# Altium footprint library Relays.PcbLib: 115 footprints (part 4 of 8) (continued)
## REL_OMRON_G6K-2F-RF-T [mm] "SMD Relay,  Body 10.7mm x 6.9mm, OMRON G6KU-2F-RF-T" (continued)
Mechanical 14:
  lines w0.1: -5.513,-3.45 5.488,-3.45 ; -5.513,3.45 5.488,3.45 ; -4.663,-3.45 -4.663,-4.3 -5.513,-4.3 -5.513,-3.25 -5.15,-3.25 -5.15,3.25 -5.513,3.25 -5.513,4.3 -4.663,4.3 -4.663,3.45 ; -4.05,-3.45 -4.05,-4.05 -3.55,-4.05 -3.55,-3.45 ; -4.05,3.45 -4.05,4.05 -3.55,4.05 -3.55,3.45 ; -1.95,-3.45 -1.95,-4.3 -1.45,-4.3 -1.45,-3.45 ; -1.95,3.45 -1.95,4.3 -1.45,4.3 -1.45,3.45 ; -0.85,-3.45 -0.85,-4.05 -0.35,-4.05 -0.35,-3.45 ; -0.85,3.45 -0.85,4.05 -0.35,4.05 -0.35,3.45 ; 0.25,-3.45 0.25,-4.3 0.75,-4.3 0.75,-3.45 ; 0.25,3.45 0.25,4.3 0.75,4.3 0.75,3.45 ; 1.35,-3.45 1.35,-4.05 1.85,-4.05 1.85,-3.45 ; 1.35,3.45 1.35,4.05 1.85,4.05 1.85,3.45 ; 2.45,-3.45 2.45,-4.3 2.95,-4.3 2.95,-3.45 ; 2.45,3.45 2.45,4.3 2.95,4.3 2.95,3.45 ; 3.55,-3.45 3.55,-4.05 4.05,-4.05 4.05,-3.45 ; 3.55,3.45 3.55,4.05 4.05,4.05 4.05,3.45 ; 4.638,-3.45 4.638,-4.3 5.488,-4.3 5.488,-3.25 5.15,-3.25 5.15,3.25 5.488,3.25 5.488,4.3 4.638,4.3 4.638,3.45 ; -4.45,-2.25 ccw(c-4.2,-2.25) -3.95,-2.25 -3.95,2.25 ccw(c-4.2,2.25) -4.45,2.25 -4.45,-2.25
Mechanical 15:
  lines w0.05: -5.975,-5.65 5.975,-5.65 5.975,5.65 -5.975,5.65 -5.975,-5.65
3D body "REL_OMRON_G6K-2F-RF-T.stp": height 5.4, standoff 0, extent -5.512,-4.3 5.488,4.3

## REL_OMRON_G6K-2G-Y [mm] "SMD Relay,  Body 10.2mm x 6.7mm, (Inside-L Surface Mounting Terminal)OMRON_G6K-2F"
height 5.4
pads (8):
  rect 0.8x1.8 smd: 1(-3.9,-2.85) 2(-0.7,-2.85) 3(1.5,-2.85) 4(3.7,-2.85) 5(3.7,2.85) 6(1.5,2.85) 7(-0.7,2.85) 8(-3.9,2.85)
Top Overlay:
  circle w0.2: c1.5,-1.1 r0.159
  circle w0.2: c1.5,1.1 r0.159
  lines w0.2: -4.9,-1.2 -4.9,1.2 ; -4.8,-1.2 -4.8,1.2 ; -4.7,-3.35 -5.2,-3.35 -5.2,3.35 -4.7,3.35 ; -3.6,-1.5 -3.6,-0.5 ; -3.6,0.5 -3.6,1.4 ; -3.1,-3.35 -1.5,-3.35 ; -3.1,3.35 -1.5,3.35 ; -0.7,-1.5 -0.7,-0.6 0,-0.6 ; -0.7,1.5 -0.7,0.6 0,0.6 ; 0.1,-3.35 0.7,-3.35 ; 0.1,3.35 0.7,3.35 ; 0.6,-0.3 1.5,-1.1 ; 0.6,0.3 1.5,1.1 1.47,1.056 ; 1.5,-1.6 1.5,-1.3 ; 1.5,1.3 1.5,1.6 ; 2.3,-3.35 2.9,-3.35 ; 2.3,3.35 2.9,3.35 ; 2.6,-0.6 3.7,-0.6 3.7,-1.5 ; 2.6,0.6 3.7,0.6 3.7,1.5 ; 4.5,-3.35 5.2,-3.35 5.2,3.35 4.5,3.35 ; -5.1,-1.2 -4.7,-1.2 -4.7,1.2 -5.1,1.2 -5.1,-1.2 ; -4.3,-0.5 -4.3,0.5 -2.9,0.5 -2.9,-0.5 -4.3,-0.5 ; 0,-0.759 0.635,-0.6 0,-0.441 0,-0.759 ; 0,0.441 0,0.759 0.635,0.6 0,0.441 ; 1.965,-0.6 2.6,-0.759 2.6,-0.441 1.965,-0.6 ; 1.965,0.6 2.6,0.441 2.6,0.759 1.965,0.6
Mechanical 8:
  lines w0.1: -4.9,-2.85 -3.9,-2.85 ; -4.9,2.85 -3.9,2.85 ; -3.9,-3.85 -3.9,-2.85 ; -3.9,-1.85 -3.9,-2.85 ; -3.9,1.85 -3.9,2.85 ; -3.9,3.85 -3.9,2.85 ; -2.9,-2.85 -3.9,-2.85 ; -2.9,2.85 -3.9,2.85 ; -1.7,-2.85 -0.7,-2.85 ; -1.7,2.85 -0.7,2.85 ; -1,0 0,0 ; -0.7,-3.85 -0.7,-2.85 ; -0.7,-1.85 -0.7,-2.85 ; -0.7,1.85 -0.7,2.85 ; -0.7,3.85 -0.7,2.85 ; 0,-1 0,0 ; 0,1 0,0 ; 0.3,-2.85 -0.7,-2.85 ; 0.3,2.85 -0.7,2.85 ; 0.5,-2.85 1.5,-2.85 ; 0.5,2.85 1.5,2.85 ; 1,0 0,0 ; 1.5,-3.85 1.5,-2.85 ; 1.5,-1.85 1.5,-2.85 ; 1.5,1.85 1.5,2.85 ; 1.5,3.85 1.5,2.85 ; 2.5,-2.85 1.5,-2.85 ; 2.5,2.85 1.5,2.85 ; 2.7,-2.85 3.7,-2.85 ; 2.7,2.85 3.7,2.85 ; 3.7,-3.85 3.7,-2.85 ; 3.7,-1.85 3.7,-2.85 ; 3.7,1.85 3.7,2.85 ; 3.7,3.85 3.7,2.85 ; 4.7,-2.85 3.7,-2.85 ; 4.7,2.85 3.7,2.85 ; -4.3,-3.75 -4.3,-1.95 -3.5,-1.95 -3.5,-3.75 -4.3,-3.75 ; -4.3,1.95 -4.3,3.75 -3.5,3.75 -3.5,1.95 -4.3,1.95 ; -1.1,-3.75 -1.1,-1.95 -0.3,-1.95 -0.3,-3.75 -1.1,-3.75 ; -1.1,1.95 -1.1,3.75 -0.3,3.75 -0.3,1.95 -1.1,1.95 ; 1.1,-3.75 1.1,-1.95 1.9,-1.95 1.9,-3.75 1.1,-3.75 ; 1.1,1.95 1.1,3.75 1.9,3.75 1.9,1.95 1.1,1.95 ; 3.3,-3.75 3.3,-1.95 4.1,-1.95 4.1,-3.75 3.3,-3.75 ; 3.3,1.95 3.3,3.75 4.1,3.75 4.1,1.95 3.3,1.95
Mechanical 14:
  circle w0.1: c1.5,1.1 r0.159
  circle w0.1: c1.5,-1.1 r0.159
  lines w0.1: -4.9,-1.2 -4.9,1.2 ; -4.8,-1.2 -4.8,1.2 ; -4.7,-1.2 -4.7,1.2 ; -3.6,-1.5 -3.6,-0.5 ; -3.6,0.5 -3.6,1.4 ; -0.7,-1.5 -0.7,-0.6 0,-0.6 ; -0.7,1.5 -0.7,0.6 0,0.6 ; 0.6,-0.3 1.5,-1.1 ; 0.6,0.3 1.5,1.1 1.47,1.056 ; 1.5,-1.6 1.5,-1.3 ; 1.5,1.3 1.5,1.6 ; 2.6,-0.6 3.7,-0.6 3.7,-1.5 ; 2.6,0.6 3.7,0.6 3.7,1.5 ; -5.2,-3.35 -5.2,3.35 5.2,3.35 5.2,-3.35 -5.2,-3.35 ; -5.1,-1.2 -5.1,1.2 -4.6,1.2 -4.6,-1.2 -5.1,-1.2 ; -4.6,-1.29 ccw(c-4.1,-1.29) -3.6,-1.29 -3.6,1.29 ccw(c-4.1,1.289) -4.6,1.289 -4.6,-1.29 ; -4.3,-0.5 -2.9,-0.5 -2.9,0.5 -4.3,0.5 -4.3,-0.5 ; 0,-0.759 0,-0.441 0.635,-0.6 0,-0.759 ; 0,0.441 0.635,0.6 0,0.759 0,0.441 ; 1.965,-0.6 2.6,-0.441 2.6,-0.759 1.965,-0.6 ; 1.965,0.6 2.6,0.759 2.6,0.441 1.965,0.6
Mechanical 15:
  lines w0.05: -5.45,-4 -5.45,4 5.45,4 5.45,-4 -5.45,-4
3D body "REL_OMRON_G6K-2G-Y.stp": height 5.4, standoff 0, extent -5.2,-3.45 5.2,3.45

## REL_OMRON_G6K-2P-Y [mm] "THT Relay,  Body 10.2mm x 6.5mm, OMRON_G6K-2P"
height 5
pads (8):
  rect 1.6x1.6 hole 0.9: 1(-3.8,-2.54)
  round 1.6 hole 0.9: 2(-0.6,-2.54) 3(1.6,-2.54) 4(3.8,-2.54) 5(3.8,2.54) 6(1.6,2.54) 7(-0.6,2.54) 8(-3.8,2.54)
Top Overlay:
  lines w0.2: -4.9,-3.35 -5.1,-3.35 -5.1,3.35 -4.544,3.35 ; -3.056,3.35 -1.344,3.35 ; -2.7,-3.35 -1.344,-3.35 ; 0.144,-3.35 0.856,-3.35 ; 0.144,3.35 0.856,3.35 ; 2.344,-3.35 3.056,-3.35 ; 2.344,3.35 3.056,3.35 ; 4.544,-3.35 5.1,-3.35 5.1,3.35 4.544,3.35 ; -4.85,-1.1 ccw(c-4.6,-1.1) -4.35,-1.1 -4.35,-0.1 ccw(c-4.6,-0.1) -4.85,-0.1 -4.85,-1.1
Mechanical 8:
  lines w0.1: -4.3,-2.54 -3.8,-2.54 ; -4.3,2.54 -3.8,2.54 ; -3.8,-3.04 -3.8,-2.54 ; -3.8,-2.04 -3.8,-2.54 ; -3.8,2.04 -3.8,2.54 ; -3.8,3.04 -3.8,2.54 ; -3.3,-2.54 -3.8,-2.54 ; -3.3,2.54 -3.8,2.54 ; -1.1,-2.54 -0.6,-2.54 ; -1.1,2.54 -0.6,2.54 ; -0.6,-3.04 -0.6,-2.54 ; -0.6,-2.04 -0.6,-2.54 ; -0.6,2.04 -0.6,2.54 ; -0.6,3.04 -0.6,2.54 ; -0.5,0 0,0 ; -0.1,-2.54 -0.6,-2.54 ; -0.1,2.54 -0.6,2.54 ; 0,-0.5 0,0 ; 0,0.5 0,0 ; 0.5,0 0,0 ; 1.1,-2.54 1.6,-2.54 ; 1.1,2.54 1.6,2.54 ; 1.6,-3.04 1.6,-2.54 ; 1.6,-2.04 1.6,-2.54 ; 1.6,2.04 1.6,2.54 ; 1.6,3.04 1.6,2.54 ; 2.1,-2.54 1.6,-2.54 ; 2.1,2.54 1.6,2.54 ; 3.3,-2.54 3.8,-2.54 ; 3.3,2.54 3.8,2.54 ; 3.8,-3.04 3.8,-2.54 ; 3.8,-2.04 3.8,-2.54 ; 3.8,2.04 3.8,2.54 ; 3.8,3.04 3.8,2.54 ; 4.3,-2.54 3.8,-2.54 ; 4.3,2.54 3.8,2.54
Mechanical 14:
  lines w0.1: -5.1,-3.35 -5.1,3.35 5.1,3.35 5.1,-3.35 -5.1,-3.35 ; -4.85,-1.1 ccw(c-4.6,-1.1) -4.35,-1.1 -4.35,-0.1 ccw(c-4.6,-0.1) -4.85,-0.1 -4.85,-1.1 ; -0.75,2.6 ccw(c0,2.6) 0.75,2.6 0.75,3.35 -0.75,3.35 -0.75,2.6
3D body "REL_OMRON_G6K-2P-Y.stp": height 5, standoff -3.5, extent -5.1,-3.35 5.1,3.35

## REL_OMRON_G6KU-2F-Y [mm] "SMD Relay,  Body 10.2mm x 6.7mm, OMRON_G6KU-2F-Y"
height 5.4
pads (8):
  rect 0.8x1.8 smd: 1(-3.8,-3.5) 2(-0.6,-3.5) 3(1.6,-3.5) 4(3.8,-3.5) 5(3.8,3.5) 6(1.6,3.5) 7(-0.6,3.5) 8(-3.8,3.5)
Top Overlay:
  circle w0.2: c1.6,-1.8 r0.159
  circle w0.2: c1.6,1.8 r0.159
  lines w0.2: -5,-1.2 -4.6,-1.2 -4.6,1.2 -5,1.2 ; -4.9,-1.2 -4.9,1.2 ; -4.8,-1.2 -4.8,1.2 ; -4.7,-1.2 -4.7,1.2 ; -4.6,-3.35 -5.1,-3.35 -5.1,3.35 -4.6,3.35 ; -3.8,-2.15 -3.8,-0.6 ; -3.8,0.6 -3.8,2.15 ; -3,-3.35 -1.4,-3.35 ; -3,3.35 -1.4,3.35 ; -0.6,-2.15 -0.6,-0.6 0.1,-0.6 ; -0.6,2.15 -0.6,0.6 0.1,0.6 ; 0.2,-3.35 0.8,-3.35 ; 0.2,3.35 0.8,3.35 ; 0.593,-0.338 1.5,-1.675 ; 0.593,0.338 1.5,1.675 ; 1.6,-2.15 1.6,-2 ; 1.6,2 1.6,2.15 ; 2.4,-3.35 3,-3.35 ; 2.4,3.35 3,3.35 ; 2.7,-0.6 3.8,-0.6 3.8,-2.15 ; 2.7,0.6 3.8,0.6 3.8,2.15 ; 4.6,-3.35 5.1,-3.35 5.1,3.35 4.6,3.35 ; -4.2,-0.5 -2.8,-0.5 -2.8,0.5 -4.2,0.5 -4.2,-0.5 ; 0.1,-0.759 0.1,-0.441 0.735,-0.6 0.1,-0.759 ; 0.1,0.441 0.735,0.6 0.1,0.759 0.1,0.441 ; 2.065,-0.6 2.7,-0.441 2.7,-0.759 2.065,-0.6 ; 2.065,0.6 2.7,0.759 2.7,0.441 2.065,0.6
  text "+" at -3.234,-1.785 h0.8
  text "-" at -3.284,0.89 h0.8
Mechanical 8:
  lines w0.1: -4.3,-3.5 -3.8,-3.5 ; -4.3,3.5 -3.8,3.5 ; -3.8,-4 -3.8,-3.5 ; -3.8,-3 -3.8,-3.5 ; -3.8,3 -3.8,3.5 ; -3.8,4 -3.8,3.5 ; -3.3,-3.5 -3.8,-3.5 ; -3.3,3.5 -3.8,3.5 ; -1.1,-3.5 -0.6,-3.5 ; -1.1,3.5 -0.6,3.5 ; -0.6,-4 -0.6,-3.5 ; -0.6,-3 -0.6,-3.5 ; -0.6,3 -0.6,3.5 ; -0.6,4 -0.6,3.5 ; -0.5,0 0,0 ; -0.1,-3.5 -0.6,-3.5 ; -0.1,3.5 -0.6,3.5 ; 0,-0.5 0,0 ; 0,0.5 0,0 ; 0.5,0 0,0 ; 1.1,-3.5 1.6,-3.5 ; 1.1,3.5 1.6,3.5 ; 1.6,-4 1.6,-3.5 ; 1.6,-3 1.6,-3.5 ; 1.6,3 1.6,3.5 ; 1.6,4 1.6,3.5 ; 2.1,-3.5 1.6,-3.5 ; 2.1,3.5 1.6,3.5 ; 3.3,-3.5 3.8,-3.5 ; 3.3,3.5 3.8,3.5 ; 3.8,-4 3.8,-3.5 ; 3.8,-3 3.8,-3.5 ; 3.8,3 3.8,3.5 ; 3.8,4 3.8,3.5 ; 4.3,-3.5 3.8,-3.5 ; 4.3,3.5 3.8,3.5 ; -4.2,-4.4 -3.4,-4.4 -3.4,-2.6 -4.2,-2.6 -4.2,-4.4 ; -4.2,2.6 -3.4,2.6 -3.4,4.4 -4.2,4.4 -4.2,2.6 ; -1,-4.4 -0.2,-4.4 -0.2,-2.6 -1,-2.6 -1,-4.4 ; -1,2.6 -0.2,2.6 -0.2,4.4 -1,4.4 -1,2.6 ; 1.2,-4.4 2,-4.4 2,-2.6 1.2,-2.6 1.2,-4.4 ; 1.2,2.6 2,2.6 2,4.4 1.2,4.4 1.2,2.6 ; 3.4,-4.4 4.2,-4.4 4.2,-2.6 3.4,-2.6 3.4,-4.4 ; 3.4,2.6 4.2,2.6 4.2,4.4 3.4,4.4 3.4,2.6
Mechanical 14:
  circle w0.1: c1.6,-1.8 r0.159
  circle w0.1: c1.6,1.8 r0.159
  lines w0.1: -5,-1.2 -4.5,-1.2 -4.5,1.2 -5,1.2 ; -4.9,-1.2 -4.9,1.2 ; -4.8,-1.2 -4.8,1.2 ; -4.7,-1.2 -4.7,1.2 ; -4.6,-1.2 -4.6,1.2 ; -3.8,-2.15 -3.8,-0.6 ; -3.8,0.6 -3.8,2.15 ; -0.6,-2.15 -0.6,-0.6 0.1,-0.6 ; -0.6,2.15 -0.6,0.6 0.1,0.6 ; 0.593,-0.338 1.5,-1.675 ; 0.593,0.338 1.5,1.675 ; 1.6,-2.15 1.6,-2 ; 1.6,2 1.6,2.15 ; 2.7,-0.6 3.8,-0.6 3.8,-2.15 ; 2.7,0.6 3.8,0.6 3.8,2.15 ; -5.1,-3.35 5.1,-3.35 5.1,3.35 -5.1,3.35 -5.1,-3.35 ; -4.2,-0.5 -2.8,-0.5 -2.8,0.5 -4.2,0.5 -4.2,-0.5 ; 0.1,-0.759 0.1,-0.441 0.735,-0.6 0.1,-0.759 ; 0.1,0.441 0.735,0.6 0.1,0.759 0.1,0.441 ; 2.065,-0.6 2.7,-0.441 2.7,-0.759 2.065,-0.6 ; 2.065,0.6 2.7,0.759 2.7,0.441 2.065,0.6
  text "+" at -3.234,-1.785 h0.8
  text "-" at -3.284,0.89 h0.8
Mechanical 15:
  lines w0.05: -5.35,-4.65 -5.35,4.65 5.35,4.65 5.35,-4.65 -5.35,-4.65
3D body "REL_OMRON_G6KU-2F-Y.stp": height 5.4, standoff 0, extent -5.1,-3.9 5.1,3.9

## REL_OMRON_G6RL-1 [mm] "5 Leads, Row Spacing 7.62 mm; Body 28.5mm x 10mm, OMRON_G6RL-1 Series"
height 12.3
pads (5):
  rect 2x2 hole 1.3: 1(-12.75,-3.81)
  round 2 hole 1.3: 2(9.35,-3.81) 3(12.55,3.81) 4(6.15,3.81) 5(-12.75,3.81)
Top Overlay:
  circle w0.2: c9.4,-0.675 r0.159
  lines w0.2: -13.488,-5 -14.25,-5 -14.25,5 -13.488,5 ; -12.013,-5 8.613,-5 ; -12.013,5 5.413,5 ; -11.084,-3.8 -9.179,-3.8 -9.179,-0.752 ; -11.084,3.82 -9.179,3.82 -9.179,0.772 ; 6.1,2.4 6.1,0.547 8.13,0.547 ; 6.887,5 11.813,5 ; 8.765,0.865 9.339,-0.528 ; 9.4,-2.4 9.4,-0.834 ; 10.088,-5 14.25,-5 14.25,5 13.288,5 ; 10.67,0.547 12.6,0.547 12.6,2.4 ; -13.75,-2 -13.75,2 ; -13.75,-2 -12.25,-2 ; -13.75,-2 -12.25,-2 ; -13.75,-2 -13.75,2 ; -13.75,2 -12.25,2 ; -13.75,2 -12.25,2 ; -12.25,-2 -12.25,2 ; -12.25,-2 -12.25,2 ; -13.55,-2 -13.55,2 -13.55,-2 ; -13.35,-2 -13.35,2 -13.35,-2 ; -13.15,-2 -13.15,2 -13.15,-2 ; -12.95,-2 -12.95,2 -12.95,-2 ; -12.75,-2 -12.75,2 -12.75,-2 ; -12.55,-2 -12.55,2 -12.55,-2 ; -12.35,-2 -12.35,2 -12.35,-2 ; -10.449,-0.752 -7.909,-0.752 -7.909,0.772 -10.449,0.772 -10.449,-0.752 ; 8.13,0.389 8.765,0.547 8.13,0.706 8.13,0.389 ; 10.035,0.547 10.67,0.706 10.67,0.389 10.035,0.547
Mechanical 8:
  lines w0.1: -13.75,-3.81 -12.75,-3.81 ; -13.75,3.81 -12.75,3.81 ; -12.75,-4.81 -12.75,-3.81 ; -12.75,-2.81 -12.75,-3.81 ; -12.75,2.81 -12.75,3.81 ; -12.75,4.81 -12.75,3.81 ; -11.75,-3.81 -12.75,-3.81 ; -11.75,3.81 -12.75,3.81 ; -1,0 0,0 ; 0,-1 0,0 ; 0,1 0,0 ; 1,0 0,0 ; 5.15,3.81 6.15,3.81 ; 6.15,2.81 6.15,3.81 ; 6.15,4.81 6.15,3.81 ; 7.15,3.81 6.15,3.81 ; 8.35,-3.81 9.35,-3.81 ; 9.35,-4.81 9.35,-3.81 ; 9.35,-2.81 9.35,-3.81 ; 10.35,-3.81 9.35,-3.81 ; 11.55,3.81 12.55,3.81 ; 12.55,2.81 12.55,3.81 ; 12.55,4.81 12.55,3.81 ; 13.55,3.81 12.55,3.81
Mechanical 14:
  lines w0.1: -14.25,-5 -14.25,5 ; -13.75,-5 -13.75,5 ; -12.25,-5 -12.25,5 ; -11.084,-3.8 -9.179,-3.8 -9.179,-0.752 ; -11.084,3.82 -9.179,3.82 -9.179,0.772 ; -10.449,-0.752 -7.909,-0.752 -7.909,0.772 -10.449,0.772 -10.449,-0.752
3D body "REL_OMRON_G6RL-1.stp": height 12.3, standoff -3.2, extent -14.25,-5 14.25,5

## REL_PANASONIC_AGQ200A [mm] "8 Leads Single Side Stable Relay,PANASONIC GQ Series, Body 10.6mm x 7.2mm"
height 5.4
pads (8):
  rect 0.8x2.66 smd: 1(-3.8,-3.37) 2(-0.6,-3.37) 3(1.6,-3.37) 4(3.8,-3.37) 5(3.8,3.37) 6(1.6,3.37) 7(-0.6,3.37) 8(-3.8,3.37)
Top Overlay:
  lines w0.2: -4.6,-3.75 -5.45,-3.75 -5.45,3.75 -4.6,3.75 ; -3.8,-1.6 -3.8,-0.8 ; -3.8,0.8 -3.8,1.6 ; -3,-3.75 -1.4,-3.75 ; -3,3.75 -1.4,3.75 ; -2.8,-1.6 -1.8,-1.6 ; -2.8,1.6 -1.8,1.6 ; -2.3,-2.1 -2.3,-1.1 ; -0.6,-1.6 -0.6,-0.8 0.7,-0.8 ; -0.6,1.6 -0.6,0.8 0.7,0.8 ; 0.2,-3.75 0.8,-3.75 ; 0.2,3.75 0.8,3.75 ; 0.6,-0.4 1.6,-1.2 1.6,-1.6 ; 0.6,0.4 1.6,1.2 1.6,1.6 ; 2.4,-3.75 3,-3.75 ; 2.4,3.75 3,3.75 ; 2.5,-0.8 3.8,-0.8 3.8,-1.6 ; 2.5,0.8 3.8,0.8 3.8,1.6 ; 4.6,-3.75 5.45,-3.75 5.45,3.75 4.6,3.75 ; -5.2,-2.5 -5.2,2.5 -4.6,2.5 -4.6,-2.5 -5.2,-2.5 ; -4.2,-0.8 -3.4,-0.8 -3.4,0.8 -4.2,0.8 -4.2,-0.8
Mechanical 8:
  lines w0.1: -4.3,-3.37 -3.8,-3.37 ; -4.3,3.37 -3.8,3.37 ; -3.8,-3.87 -3.8,-3.37 ; -3.8,-2.87 -3.8,-3.37 ; -3.8,2.87 -3.8,3.37 ; -3.8,3.87 -3.8,3.37 ; -3.3,-3.37 -3.8,-3.37 ; -3.3,3.37 -3.8,3.37 ; -1.1,-3.37 -0.6,-3.37 ; -1.1,3.37 -0.6,3.37 ; -0.6,-3.87 -0.6,-3.37 ; -0.6,-2.87 -0.6,-3.37 ; -0.6,2.87 -0.6,3.37 ; -0.6,3.87 -0.6,3.37 ; -0.5,0 0,0 ; -0.1,-3.37 -0.6,-3.37 ; -0.1,3.37 -0.6,3.37 ; 0,-0.5 0,0 ; 0,0.5 0,0 ; 0.5,0 0,0 ; 1.1,-3.37 1.6,-3.37 ; 1.1,3.37 1.6,3.37 ; 1.6,-3.87 1.6,-3.37 ; 1.6,-2.87 1.6,-3.37 ; 1.6,2.87 1.6,3.37 ; 1.6,3.87 1.6,3.37 ; 2.1,-3.37 1.6,-3.37 ; 2.1,3.37 1.6,3.37 ; 3.3,-3.37 3.8,-3.37 ; 3.3,3.37 3.8,3.37 ; 3.8,-3.87 3.8,-3.37 ; 3.8,-2.87 3.8,-3.37 ; 3.8,2.87 3.8,3.37 ; 3.8,3.87 3.8,3.37 ; 4.3,-3.37 3.8,-3.37 ; 4.3,3.37 3.8,3.37 ; -4.2,-4.7 -4.2,-2.04 -3.4,-2.04 -3.4,-4.7 -4.2,-4.7 ; -4.2,2.04 -4.2,4.7 -3.4,4.7 -3.4,2.04 -4.2,2.04 ; -1,-4.7 -1,-2.04 -0.2,-2.04 -0.2,-4.7 -1,-4.7 ; -1,2.04 -1,4.7 -0.2,4.7 -0.2,2.04 -1,2.04 ; 1.2,-4.7 1.2,-2.04 2,-2.04 2,-4.7 1.2,-4.7 ; 1.2,2.04 1.2,4.7 2,4.7 2,2.04 1.2,2.04 ; 3.4,-4.7 3.4,-2.04 4.2,-2.04 4.2,-4.7 3.4,-4.7 ; 3.4,2.04 3.4,4.7 4.2,4.7 4.2,2.04 3.4,2.04
Mechanical 14:
  lines w0.1: -3.8,-1.6 -3.8,-0.8 ; -3.8,0.8 -3.8,1.6 ; -2.8,-1.6 -1.8,-1.6 ; -2.8,1.6 -1.8,1.6 ; -2.3,-2.1 -2.3,-1.1 ; -0.6,-1.6 -0.6,-0.8 0.7,-0.8 ; -0.6,1.6 -0.6,0.8 0.7,0.8 ; 0.6,-0.4 1.6,-1.2 1.6,-1.6 ; 0.6,0.4 1.6,1.2 1.6,1.6 ; 2.5,-0.8 3.8,-0.8 3.8,-1.6 ; 2.5,0.8 3.8,0.8 3.8,1.6 ; -5.45,-3.75 5.45,-3.75 5.45,3.75 -5.45,3.75 -5.45,-3.75 ; -5.2,-2.5 -5.2,2.5 -4.6,2.5 -4.6,-2.5 -5.2,-2.5 ; -4.2,-0.8 -4.2,0.8 -3.4,0.8 -3.4,-0.8 -4.2,-0.8
Mechanical 15:
  lines w0.05: -5.7,-4.95 -5.7,4.95 5.7,4.95 5.7,-4.95 -5.7,-4.95
3D body "REL_PANASONIC_AGQ200A.stp": height 5.4, standoff 0, extent -5.45,-4.364 5.45,4.364

## REL_PANASONIC_DK1A [mm] "4 Leads Single Side Stable Relay,PANASONIC DK Series, Body 20mm x 12.5mm"
height 10
pads (4):
  round 1.8 hole 1.1: 1(-8.89,-5.08) 3(1.27,-5.08) 4(8.89,-5.08) 6(-8.89,5.08)
Top Overlay:
  lines w0.2: -10,-5.757 -10,-6.25 -9.457,-6.25 ; -10,-4.403 -10,4.403 ; -10,5.757 -10,6.25 -9.457,6.25 ; -8.323,-6.25 0.703,-6.25 ; -8.323,6.25 10,6.25 10,-6.25 9.457,-6.25 ; 1.837,-6.25 8.323,-6.25 ; -9,-3.25 -8,-3.25 -8,3.25 -9,3.25 -9,-3.25
Mechanical 8:
  lines w0.1: -9.39,-5.08 -8.89,-5.08 ; -9.39,5.08 -8.89,5.08 ; -8.89,-5.58 -8.89,-5.08 ; -8.89,-4.58 -8.89,-5.08 ; -8.89,4.58 -8.89,5.08 ; -8.89,5.58 -8.89,5.08 ; -8.39,-5.08 -8.89,-5.08 ; -8.39,5.08 -8.89,5.08 ; -0.5,0 0,0 ; 0,-0.5 0,0 ; 0,0.5 0,0 ; 0.5,0 0,0 ; 0.77,-5.08 1.27,-5.08 ; 1.27,-5.58 1.27,-5.08 ; 1.27,-4.58 1.27,-5.08 ; 1.77,-5.08 1.27,-5.08 ; 8.39,-5.08 8.89,-5.08 ; 8.89,-5.58 8.89,-5.08 ; 8.89,-4.58 8.89,-5.08 ; 9.39,-5.08 8.89,-5.08
Mechanical 14:
  lines w0.1: -8.89,-6.25 -2.54,-6.25 ; -7.59,-5.08 -5.59,-5.08 -5.59,-2 ; -7.59,5.08 -5.59,5.08 -5.59,2 ; -7.09,-4.08 -6.09,-4.08 ; -7.09,4.08 -6.09,4.08 ; -6.59,3.58 -6.59,4.58 ; 1.27,-3.78 1.27,-1.78 9.473,0.066 ; 8.89,-3.78 8.89,-1.78 ; -10,-6.25 -10,6.25 10,6.25 10,-6.25 -10,-6.25 ; -9,-3.25 -8,-3.25 -8,3.25 -9,3.25 -9,-3.25 ; -6.59,-2 -4.59,-2 -4.59,2 -6.59,2 -6.59,-2 ; 8.39,-1.78 9.39,-1.78 8.89,-1.28 8.39,-1.78
3D body "REL_PANASONIC_DK1A.stp": height 10, standoff -3.5, extent -10,-6.25 10,6.25

## REL_PANASONIC_DK2A [mm] "6 Leads Single Side Stable DPST (2 Form A) Relay,PANASONIC DK Series, Body 20mm x 15mm"
height 10
pads (6):
  round 1.8 hole 1.1: 1(-8.89,-5.08) 3(1.27,-5.08) 4(8.89,-5.08) 5(8.89,5.08) 6(1.27,5.08) 8(-8.89,5.08)
Top Overlay:
  lines w0.2: -10,-5.757 -10,-7.5 10,-7.5 10,-5.757 ; -10,-4.403 -10,4.403 ; -10,5.757 -10,7.5 10,7.5 10,5.757 ; 10,-4.403 10,4.403 ; -9,-3.25 -8,-3.25 -8,3.25 -9,3.25 -9,-3.25
Mechanical 8:
  lines w0.1: -9.39,-5.08 -8.89,-5.08 ; -9.39,5.08 -8.89,5.08 ; -8.89,-5.58 -8.89,-5.08 ; -8.89,-4.58 -8.89,-5.08 ; -8.89,4.58 -8.89,5.08 ; -8.89,5.58 -8.89,5.08 ; -8.39,-5.08 -8.89,-5.08 ; -8.39,5.08 -8.89,5.08 ; -0.5,0 0,0 ; 0,-0.5 0,0 ; 0,0.5 0,0 ; 0.5,0 0,0 ; 0.77,-5.08 1.27,-5.08 ; 0.77,5.08 1.27,5.08 ; 1.27,-5.58 1.27,-5.08 ; 1.27,-4.58 1.27,-5.08 ; 1.27,4.58 1.27,5.08 ; 1.27,5.58 1.27,5.08 ; 1.77,-5.08 1.27,-5.08 ; 1.77,5.08 1.27,5.08 ; 8.39,-5.08 8.89,-5.08 ; 8.39,5.08 8.89,5.08 ; 8.89,-5.58 8.89,-5.08 ; 8.89,-4.58 8.89,-5.08 ; 8.89,4.58 8.89,5.08 ; 8.89,5.58 8.89,5.08 ; 9.39,-5.08 8.89,-5.08 ; 9.39,5.08 8.89,5.08
Mechanical 14:
  lines w0.1: -7.59,-5.08 -5.59,-5.08 -5.59,-2 ; -7.59,5.08 -5.59,5.08 -5.59,2 ; -7.09,-4.08 -6.09,-4.08 ; -7.09,4.08 -6.09,4.08 ; -6.59,3.58 -6.59,4.58 ; 1.27,-3.78 1.27,-2.78 9.473,-0.934 ; 1.27,3.78 1.27,2.78 9.473,0.934 ; 8.89,-3.78 8.89,-2.78 ; 8.89,2.78 8.89,3.78 ; -10,-7.5 10,-7.5 10,7.5 -10,7.5 -10,-7.5 ; -9,-3.25 -8,-3.25 -8,3.25 -9,3.25 -9,-3.25 ; -6.59,-2 -4.59,-2 -4.59,2 -6.59,2 -6.59,-2 ; 8.39,-2.78 9.39,-2.78 8.89,-2.28 8.39,-2.78 ; 8.39,2.78 9.39,2.78 8.89,2.28 8.39,2.78
3D body "REL_PANASONIC_DK2A.stp": height 10, standoff -3.5, extent -10,-7.5 10,7.5

## REL_PANASONIC_DS2E [mm] "8 Leads Single Side Stable Relay,PANASONIC DS Series, Body 20mm x 9.9mm"
height 9.9
pads (8):
  rect 1.6x1.6 hole 0.9: 1(-8.89,-3.81)
  round 1.6 hole 0.9: 4(-1.27,-3.81) 6(3.81,-3.81) 8(8.89,-3.81) 9(8.89,3.81) 11(3.81,3.81) 13(-1.27,3.81) 16(-8.89,3.81)
Top Overlay:
  lines w0.2: -10,-4.266 -10,-4.95 -9.265,-4.95 ; -10,-3.354 -10,3.354 ; -10,4.266 -10,4.95 -9.265,4.95 ; -8.515,-4.95 -1.645,-4.95 ; -8.515,4.95 -1.645,4.95 ; -7.874,-3.81 -5.969,-3.81 -5.969,-0.762 ; -7.874,3.81 -5.969,3.81 -5.969,0.762 ; -1.27,-2.54 -1.27,-2.032 6.35,-2.032 6.35,-2.54 5.842,-3.302 ; -1.27,2.54 -1.27,2.032 6.35,2.032 6.35,2.54 5.842,3.302 ; -0.895,-4.95 3.435,-4.95 ; -0.895,4.95 3.435,4.95 ; 4.185,-4.95 8.515,-4.95 ; 4.185,4.95 8.515,4.95 ; 5.08,-3.81 5.715,-3.81 5.715,-3.048 cw(c5.588,-3.175) 5.715,-3.302 ; 5.08,3.81 5.715,3.81 5.715,3.048 ccw(c5.588,3.175) 5.715,3.302 ; 6.985,-3.302 cw(c7.112,-3.175) 6.985,-3.048 6.985,-3.81 7.62,-3.81 ; 6.985,3.302 ccw(c7.112,3.175) 6.985,3.048 6.985,3.81 7.62,3.81 ; 9.265,-4.95 10,-4.95 10,4.95 9.265,4.95 ; -7.239,-0.762 -4.699,-0.762 -4.699,0.762 -7.239,0.762 -7.239,-0.762
  text "+" at -7.6,-3.4 h1.6
  text "-" at -7.5,2.2 h1.6
Mechanical 8:
  lines w0.1: -9.89,-3.81 -8.89,-3.81 ; -9.89,3.81 -8.89,3.81 ; -8.89,-4.81 -8.89,-3.81 ; -8.89,-2.81 -8.89,-3.81 ; -8.89,2.81 -8.89,3.81 ; -8.89,4.81 -8.89,3.81 ; -7.89,-3.81 -8.89,-3.81 ; -2.27,-3.81 -1.27,-3.81 ; -2.27,3.81 -1.27,3.81 ; -1.27,-4.81 -1.27,-3.81 ; -1.27,-2.81 -1.27,-3.81 ; -1.27,2.81 -1.27,3.81 ; -1.27,4.81 -1.27,3.81 ; -1,0 0,0 ; -0.27,-3.81 -1.27,-3.81 ; -0.27,3.81 -1.27,3.81 ; 0,-1 0,0 ; 0,1 0,0 ; 1,0 0,0 ; 2.81,-3.81 3.81,-3.81 ; 2.81,3.81 3.81,3.81 ; 3.81,-4.81 3.81,-3.81 ; 3.81,-2.81 3.81,-3.81 ; 3.81,2.81 3.81,3.81 ; 3.81,4.81 3.81,3.81 ; 4.81,-3.81 3.81,-3.81 ; 4.81,3.81 3.81,3.81 ; 7.89,-3.81 8.89,-3.81 ; 7.89,3.81 8.89,3.81 ; 8.89,-4.81 8.89,-3.81 ; 8.89,-2.81 8.89,-3.81 ; 8.89,2.81 8.89,3.81 ; 8.89,4.81 8.89,3.81 ; 9.89,-3.81 8.89,-3.81 ; 9.89,3.81 8.89,3.81 ; -8.89,3.81 -7.89,3.81 -8.89,3.81
Mechanical 14:
  lines w0.1: -7.874,-3.81 -5.969,-3.81 -5.969,-0.762 ; -7.874,3.81 -5.969,3.81 -5.969,0.762 ; -1.27,-2.54 -1.27,-2.032 6.35,-2.032 6.35,-2.54 5.842,-3.302 ; -1.27,2.54 -1.27,2.032 6.35,2.032 6.35,2.54 5.842,3.302 ; 5.08,-3.81 5.715,-3.81 5.715,-3.048 cw(c5.588,-3.175) 5.715,-3.302 ; 5.08,3.81 5.715,3.81 5.715,3.048 ccw(c5.588,3.175) 5.715,3.302 ; 6.985,-3.302 cw(c7.112,-3.175) 6.985,-3.048 6.985,-3.81 7.62,-3.81 ; 6.985,3.302 ccw(c7.112,3.175) 6.985,3.048 6.985,3.81 7.62,3.81 ; -10,-4.95 10,-4.95 10,4.95 -10,4.95 -10,-4.95 ; -7.239,-0.762 -4.699,-0.762 -4.699,0.762 -7.239,0.762 -7.239,-0.762
  text "+" at -7.6,-3.4 h1.6
  text "-" at -7.5,2.2 h1.6
3D body "REL_PANASONIC_DS2E.stp": height 9.9, standoff -3.4, extent -10,-4.95 10,4.95